# Altium schematic symbol library BARKO_SCHLIB.SchLib: 1064 symbols (part 7 of 11)
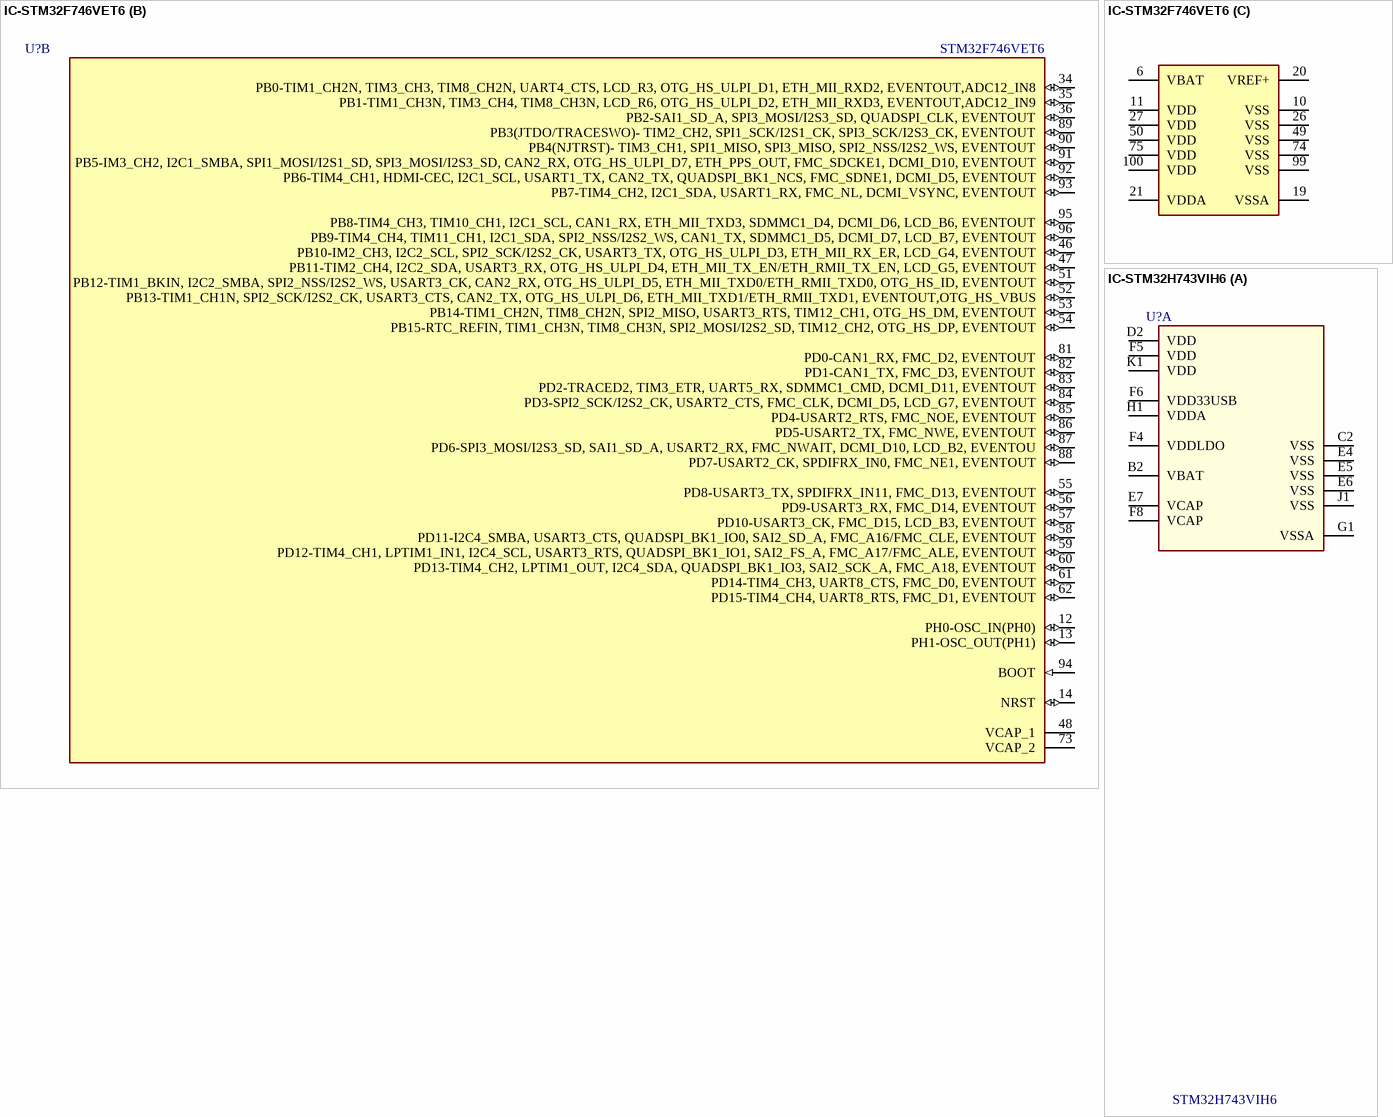
[diagram p47: symbols IC-STM32F746VET6 to IC-STM32H743VIH6]

## IC-STM32F746VET6
designator U?, comment STM32F746VET6
IC MCU 32BIT 512KB FLASH 100LQFP; Manufacturer: STMicroelectronics; Program Memory Size: 512 KByte; Packing: Tray; Supply Voltage Max: 3.6 V; Supply Voltage Min: 1.7 V; Data RAM Size: 320 KByte; L1 Cache Instruction Memory: 4 KByte; Clock Frequency Max: 216 MHz; Number of I/Os: 82; Frequency: 216MHz; RAM Size: 340KB; Min Supply Voltage: 1.7V; Max Supply Voltage: 3.6V; Washability: OK; .Creator: M.OZKAN; .PCBCHK: USED; PackageDescription: 100-Pin Low Profile Quad Flat Package, 14 x 14 mm Body, 0.5 mm Pitch; ComponentLink3URL: http://www.st.com/st-web-ui/static/active/en/resource/technical/document/data_brief/DM00071938.pdf; ComponentLink2URL: http://www.st.com/st-web-ui/static/active/en/resource/technical/document/datasheet/DM00166116.pdf; Mounting Technology: Surface Mount; Temperature Max: 85 degC; ComponentLink1Description: Manufacturer URL; ComponentLink3Description: Package Specification; Temperature Min: -40 degC; PartNumber: STM32F746VE; ComponentLink2Description: Datasheet; ComponentLink1URL: http://www.st.com/web/en/home.html; L1 Cache Data Memory: 4 KByte; DatasheetVersion: Rev. 1; Supplier 1: Digi-Key; Manufacturer Part Number: STM32F746VET6; Stock 1: 527; Pricing 1: 1=11.87000, 10=10.72200, 100=8.87720, 500=7.73016, 1000=6.73272 (USD); RoHS: No; Case/Package: LQFP; Number of Pins: 100; Memory Size: 512KB; REACH SVHC: No SVHC; ComponentLink4URL: http://www.mouser.com/ds/2/389/stm32f745ie-956321.pdf?src-supplier=Mouser; ComponentLink4Description: http://www.mouser.com/ds/2/389/stm32f745ie-956321.pdf?src-supplier=Mouser; ComponentLink5URL: http://www.farnell.com/datasheets/1994626.pdf?src-supplier=Farnell; ComponentLink5Description: http://www.farnell.com/datasheets/1994626.pdf?src-supplier=Farnell; ComponentLink6URL: http://www.farnell.com/datasheets/1994626.pdf?src-supplier=Element14; ComponentLink6Description: http://www.farnell.com/datasheets/1994626.pdf?src-supplier=Element14; ComponentLink7URL: http://www.st.com/content/ccc/resource/technical/document/errata_sheet/4d/39/a6/8c/84/47/47/67/DM00145382.pdf/files/DM00145382.pdf/jcr:content/translations/en.DM00145382.pdf?src-supplier=Digi-Key; ComponentLink7Description: http://www.st.com/content/ccc/resource/technical/document/errata_sheet/4d/39/a6/8c/84/47/47/67/DM00145382.pdf/files/DM00145382.pdf/jcr:content/translations/en.DM00145382.pdf?src-supplier=Digi-Key; Supplier Part Number 1: 497-16607-ND; .SCHCHK: USED
footprint STM-LQFP100_V (Thin QFP, 100-Leads, Body 14x14mm, Pitch 0.5mm, ST Recommended)
part A pins: 1 PE2-TRACECLK, SPI4_SCK, SAI1_MCLK_A, QUADSPI_BK1_IO2, ETH_MII_TXD3, FMC_A23, EVENTOUT (io), 2 PE3-TRACED0, SAI1_SD_B, FMC_A19, EVENTOUT (io), 3 PE4-TRACED1, SPI4_NSS, SAI1_FS_A, FMC_A20, DCMI_D4, LCD_B0, EVENTOUT (io), 4 PE5-TRACED2, TIM9_CH1, SPI4_MISO, SAI1_SCK_A, FMC_A21, DCMI_D6, LCD_G0, EVENTOUT (io), 5 PE6-TRACED3, TIM1_BKIN2, TIM9_CH2, SPI4_MOSI, SAI1_SD_A, SAI2_MCK_B, FMC_A22, DCMI_D7, LCD_G1, EVENTOUT (io), 7 PC13-RTC_TAMP1/RTC_TS/RTC_OUT,WKUP4,EVENTOUT (io), 8 PC14-OSC32_IN(PC14),EVENTOUT (io), 9 PC15-OSC32_OUT(PC15),EVENTOUT (io), 15 PC0-SAI2_FS_B, OTG_HS_ULPI_STP, FMC_SDNWE, LCD_R5, EVENTOUT,ADC123_IN10 (io), 16 PC1-TRACED0, SPI2_MOSI/I2S2_SD, SAI1_SD_A, ETH_MDC, EVENTOUT,ADC123_IN11, RTC_TAMP3, WKUP3 (io), 17 PC2-SPI2_MISO, OTG_HS_ULPI_DIR, ETH_MII_TXD2, FMC_SDNE0, EVENTOUT,ADC123_IN12 (io), 18 PC3-SPI2_MOSI/I2S2_SD, OTG_HS_ULPI_NXT, ETH_MII_TX_CLK, FMC_SDCKE0, EVENTOUT,ADC123_IN13 (io), 22 PA0-WKUP(PA0)-TIM2_CH1/TIM2_ETR, TIM5_CH1, TIM8_ETR, USART2_CTS, UART4_TX, SAI2_SD_B, ETH_MII_CRS, EVENTOUT (io), 23 PA1-TIM2_CH2, TIM5_CH2, USART2_RTS, UART4_RX, QUADSPI_BK1_IO3, SAI2_MCK_B, ETH_MII_RX_CLK/ETH_RMII_REF_CLK, LCD_R2, EVENTOUT,ADC123_IN1 (io), 24 PA2-TIM2_CH3, TIM5_CH3, TIM9_CH1, USART2_TX, SAI2_SCK_B, ETH_MDIO, LCD_R1, EVENTOUT,ADC123_IN2, WKUP2 (io), 25 PA3-TIM2_CH4, TIM5_CH4, TIM9_CH2, USART2_RX, OTG_HS_ULPI_D0, ETH_MII_COL, LCD_B5, EVENTOUT,ADC123_IN3 (io), 28 PA4-SPI1_NSS/I2S1_WS, SPI3_NSS/I2S3_WS, USART2_CK, OTG_HS_SOF, DCMI_HSYNC, LCD_VSYNC, EVENTOUT,ADC12_IN4, DAC_OUT1 (io), 29 PA5-TIM2_CH1/TIM2_ETR, TIM8_CH1N, SPI1_SCK/I2S1_CK, OTG_HS_ULPI_CK, LCD_R4, EVENTOUT,ADC12_IN5, DAC_OUT2 (io), 30 PA6-TIM1_BKIN, TIM3_CH1, TIM8_BKIN, SPI1_MISO, TIM13_CH1, DCMI_PIXCLK, LCD_G2, EVENTOUT,ADC12_IN6 (io), 31 PA7-TIM1_CH1N, TIM3_CH2, TIM8_CH1N, SPI1_MOSI/I2S1_SD, TIM14_CH1, ETH_MII_RX_DV/ETH_RMII_CRS_DV, FMC_SDNWE, EVENTOUT,ADC12_IN7 (io), 32 PC4-I2S1_MCK, SPDIFRX_IN2, ETH_MII_RXD0/ETH_RMII_RXD0, FMC_SDNE0, EVENTOUT,ADC12_IN14 (io), 33 PC5-SPDIFRX_IN3, ETH_MII_RXD1/ETH_RMII_RXD1, FMC_SDCKE0, EVENTOUT,ADC12_IN15 (io), 37 PE7-TIM1_ETR, UART7_Rx, QUADSPI_BK2_IO0, FMC_D4, EVENTOUT (io), 38 PE8-TIM1_CH1N, UART7_Tx, QUADSPI_BK2_IO1, FMC_D5, EVENTOUT (io), 39 PE9-TIM1_CH1, UART7_RTS, QUADSPI_BK2_IO2, FMC_D6, EVENTOUT (io), 40 PE10-TIM1_CH2N, UART7_CTS, QUADSPI_BK2_IO3, FMC_D7, EVENTOUT (io), 41 PE11-TIM1_CH2, SPI4_NSS, SAI2_SD_B, FMC_D8, LCD_G3, EVENTOUT (io), 42 PE12-TIM1_CH3N, SPI4_SCK, SAI2_SCK_B, FMC_D9, LCD_B4, EVENTOUT (io), 43 PE13-TIM1_CH3, SPI4_MISO, SAI2_FS_B, FMC_D10, LCD_DE, EVENTOUT (io), 44 PE14-TIM1_CH4, SPI4_MOSI, SAI2_MCK_B, FMC_D11, LCD_CLK, EVENTOUT (io), 45 PE15-TIM1_BKIN, FMC_D12, LCD_R7, EVENTOUT (io), 63 PC6-TIM3_CH1, TIM8_CH1, I2S2_MCK, USART6_TX, SDMMC1_D6, DCMI_D0, LCD_HSYNC, EVENTOUT (io), 64 PC7-TIM3_CH2, TIM8_CH2, I2S3_MCK, USART6_RX, SDMMC1_D7, DCMI_D1, LCD_G6, EVENTOUT (io), 65 PC8-TRACED1, TIM3_CH3, TIM8_CH3, UART5_RTS, USART6_CK, SDMMC1_D0, DCMI_D2, EVENTOUT (io), 66 PC9-MCO2, TIM3_CH4, TIM8_CH4, I2C3_SDA, I2S_CKIN, UART5_CTS, QUADSPI_BK1_IO0, SDMMC1_D1, DCMI_D3, EVENTOUT (io), 67 PA8-MCO1, TIM1_CH1, TIM8_BKIN2, I2C3_SCL, USART1_CK, OTG_FS_SOF, LCD_R6, EVENTOUT (io), 68 PA9-TIM1_CH2, I2C3_SMBA, SPI2_SCK/I2S2_CK, USART1_TX, DCMI_D0, EVENTOUTOTG_FS_VBUS (io), 69 PA10-TIM1_CH3, USART1_RX, OTG_FS_ID, DCMI_D1, EVENTOUT (io), 70 PA11-TIM1_CH4, USART1_CTS, CAN1_RX, OTG_FS_DM, LCD_R4, EVENTOUT (io), 71 PA12-IM1_ETR, USART1_RTS, SAI2_FS_B, CAN1_TX, OTG_FS_DP, LCD_R5, EVENTOUT (io), 72 PA13(JTMS-SWDIO),EVENTOUT (io), 76 PA14(JTCK-SWCLK) (io), 77 PA15(JTDI) TIM2_CH1/TIM2_ETR, HDMI-CEC, SPI1_NSS/I2S1_WS, SPI3_NSS/I2S3_WS, UART4_RTS, EVENTOUT (io), 78 PC10-SPI3_SCK/I2S3_CK, USART3_TX, UART4_TX, QUADSPI_BK1_IO1, SDMMC1_D2, DCMI_D8, LCD_R2, EVENTOUT (io), 79 PC11-SPI3_MISO, USART3_RX, UART4_RX, QUADSPI_BK2_NCS, SDMMC1_D3, DCMI_D4, EVENTOUT (io), 80 PC12-TRACED3, SPI3_MOSI/I2S3_SD, USART3_CK, UART5_TX, SDMMC1_CK, DCMI_D9, EVENTOUT (io), 97 PE0-TIM4_ETR, LPTIM1_ETR, UART8_Rx, SAI2_MCK_A, FMC_NBL0, DCMI_D2, EVENTOUT (io), 98 PE1-LPTIM1_IN2, UART8_Tx, FMC_NBL1, DCMI_D3, EVENTOUT (io)
part B pins: 12 PH0-OSC_IN(PH0) (io), 13 PH1-OSC_OUT(PH1) (io), 14 NRST (io), 34 PB0-TIM1_CH2N, TIM3_CH3, TIM8_CH2N, UART4_CTS, LCD_R3, OTG_HS_ULPI_D1, ETH_MII_RXD2, EVENTOUT,ADC12_IN8 (io), 35 PB1-TIM1_CH3N, TIM3_CH4, TIM8_CH3N, LCD_R6, OTG_HS_ULPI_D2, ETH_MII_RXD3, EVENTOUT,ADC12_IN9 (io), 36 PB2-SAI1_SD_A, SPI3_MOSI/I2S3_SD, QUADSPI_CLK, EVENTOUT (io), 46 PB10-IM2_CH3, I2C2_SCL, SPI2_SCK/I2S2_CK, USART3_TX, OTG_HS_ULPI_D3, ETH_MII_RX_ER, LCD_G4, EVENTOUT (io), 47 PB11-TIM2_CH4, I2C2_SDA, USART3_RX, OTG_HS_ULPI_D4, ETH_MII_TX_EN/ETH_RMII_TX_EN, LCD_G5, EVENTOUT (io), 48 VCAP_1 (power), 51 PB12-TIM1_BKIN, I2C2_SMBA, SPI2_NSS/I2S2_WS, USART3_CK, CAN2_RX, OTG_HS_ULPI_D5, ETH_MII_TXD0/ETH_RMII_TXD0, OTG_HS_ID, EVENTOUT (io), 52 PB13-TIM1_CH1N, SPI2_SCK/I2S2_CK, USART3_CTS, CAN2_TX, OTG_HS_ULPI_D6, ETH_MII_TXD1/ETH_RMII_TXD1, EVENTOUT,OTG_HS_VBUS (io), 53 PB14-TIM1_CH2N, TIM8_CH2N, SPI2_MISO, USART3_RTS, TIM12_CH1, OTG_HS_DM, EVENTOUT (io), 54 PB15-RTC_REFIN, TIM1_CH3N, TIM8_CH3N, SPI2_MOSI/I2S2_SD, TIM12_CH2, OTG_HS_DP, EVENTOUT (io), 55 PD8-USART3_TX, SPDIFRX_IN11, FMC_D13, EVENTOUT (io), 56 PD9-USART3_RX, FMC_D14, EVENTOUT (io), 57 PD10-USART3_CK, FMC_D15, LCD_B3, EVENTOUT (io), 58 PD11-I2C4_SMBA, USART3_CTS, QUADSPI_BK1_IO0, SAI2_SD_A, FMC_A16/FMC_CLE, EVENTOUT (io), 59 PD12-TIM4_CH1, LPTIM1_IN1, I2C4_SCL, USART3_RTS, QUADSPI_BK1_IO1, SAI2_FS_A, FMC_A17/FMC_ALE, EVENTOUT (io), 60 PD13-TIM4_CH2, LPTIM1_OUT, I2C4_SDA, QUADSPI_BK1_IO3, SAI2_SCK_A, FMC_A18, EVENTOUT (io), 61 PD14-TIM4_CH3, UART8_CTS, FMC_D0, EVENTOUT (io), 62 PD15-TIM4_CH4, UART8_RTS, FMC_D1, EVENTOUT (io), 73 VCAP_2 (power), 81 PD0-CAN1_RX, FMC_D2, EVENTOUT (io), 82 PD1-CAN1_TX, FMC_D3, EVENTOUT (io), 83 PD2-TRACED2, TIM3_ETR, UART5_RX, SDMMC1_CMD, DCMI_D11, EVENTOUT (io), 84 PD3-SPI2_SCK/I2S2_CK, USART2_CTS, FMC_CLK, DCMI_D5, LCD_G7, EVENTOUT (io), 85 PD4-USART2_RTS, FMC_NOE, EVENTOUT (io), 86 PD5-USART2_TX, FMC_NWE, EVENTOUT (io), 87 PD6-SPI3_MOSI/I2S3_SD, SAI1_SD_A, USART2_RX, FMC_NWAIT, DCMI_D10, LCD_B2, EVENTOU (io), 88 PD7-USART2_CK, SPDIFRX_IN0, FMC_NE1, EVENTOUT (io), 89 PB3(JTDO/TRACESWO)- TIM2_CH2, SPI1_SCK/I2S1_CK, SPI3_SCK/I2S3_CK, EVENTOUT (io), 90 PB4(NJTRST)- TIM3_CH1, SPI1_MISO, SPI3_MISO, SPI2_NSS/I2S2_WS, EVENTOUT (io), 91 PB5-IM3_CH2, I2C1_SMBA, SPI1_MOSI/I2S1_SD, SPI3_MOSI/I2S3_SD, CAN2_RX, OTG_HS_ULPI_D7, ETH_PPS_OUT, FMC_SDCKE1, DCMI_D10, EVENTOUT (io), 92 PB6-TIM4_CH1, HDMI-CEC, I2C1_SCL, USART1_TX, CAN2_TX, QUADSPI_BK1_NCS, FMC_SDNE1, DCMI_D5, EVENTOUT (io), 93 PB7-TIM4_CH2, I2C1_SDA, USART1_RX, FMC_NL, DCMI_VSYNC, EVENTOUT (io), 94 BOOT (in), 95 PB8-TIM4_CH3, TIM10_CH1, I2C1_SCL, CAN1_RX, ETH_MII_TXD3, SDMMC1_D4, DCMI_D6, LCD_B6, EVENTOUT (io), 96 PB9-TIM4_CH4, TIM11_CH1, I2C1_SDA, SPI2_NSS/I2S2_WS, CAN1_TX, SDMMC1_D5, DCMI_D7, LCD_B7, EVENTOUT (io)
part C pins: 6 VBAT (power), 10 VSS (power), 11 VDD (power), 19 VSSA (power), 20 VREF+ (power), 21 VDDA (power), 26 VSS (power), 27 VDD (power), 49 VSS (power), 50 VDD (power), 74 VSS (power), 75 VDD (power), 99 VSS (power), 100 VDD (power)

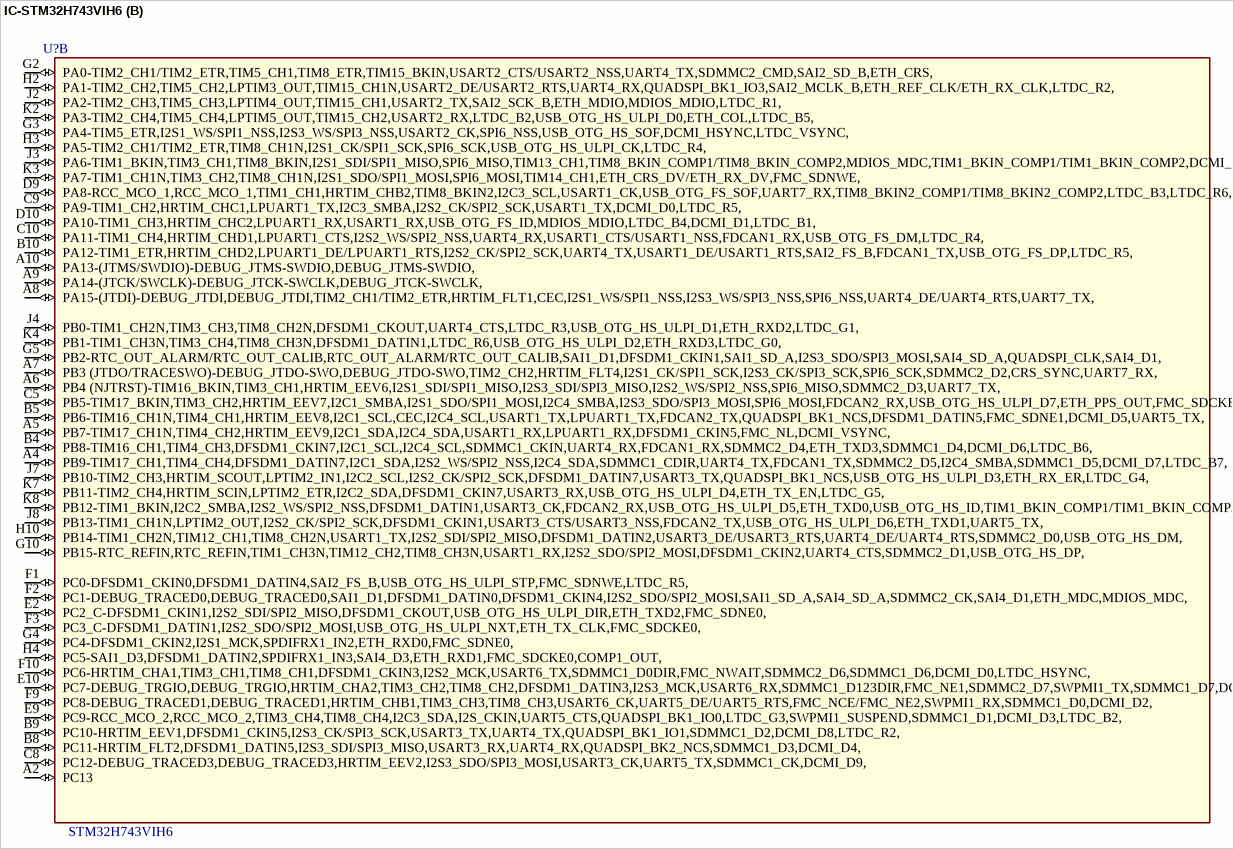
[diagram p28: symbol IC-STM32H743VIH6]

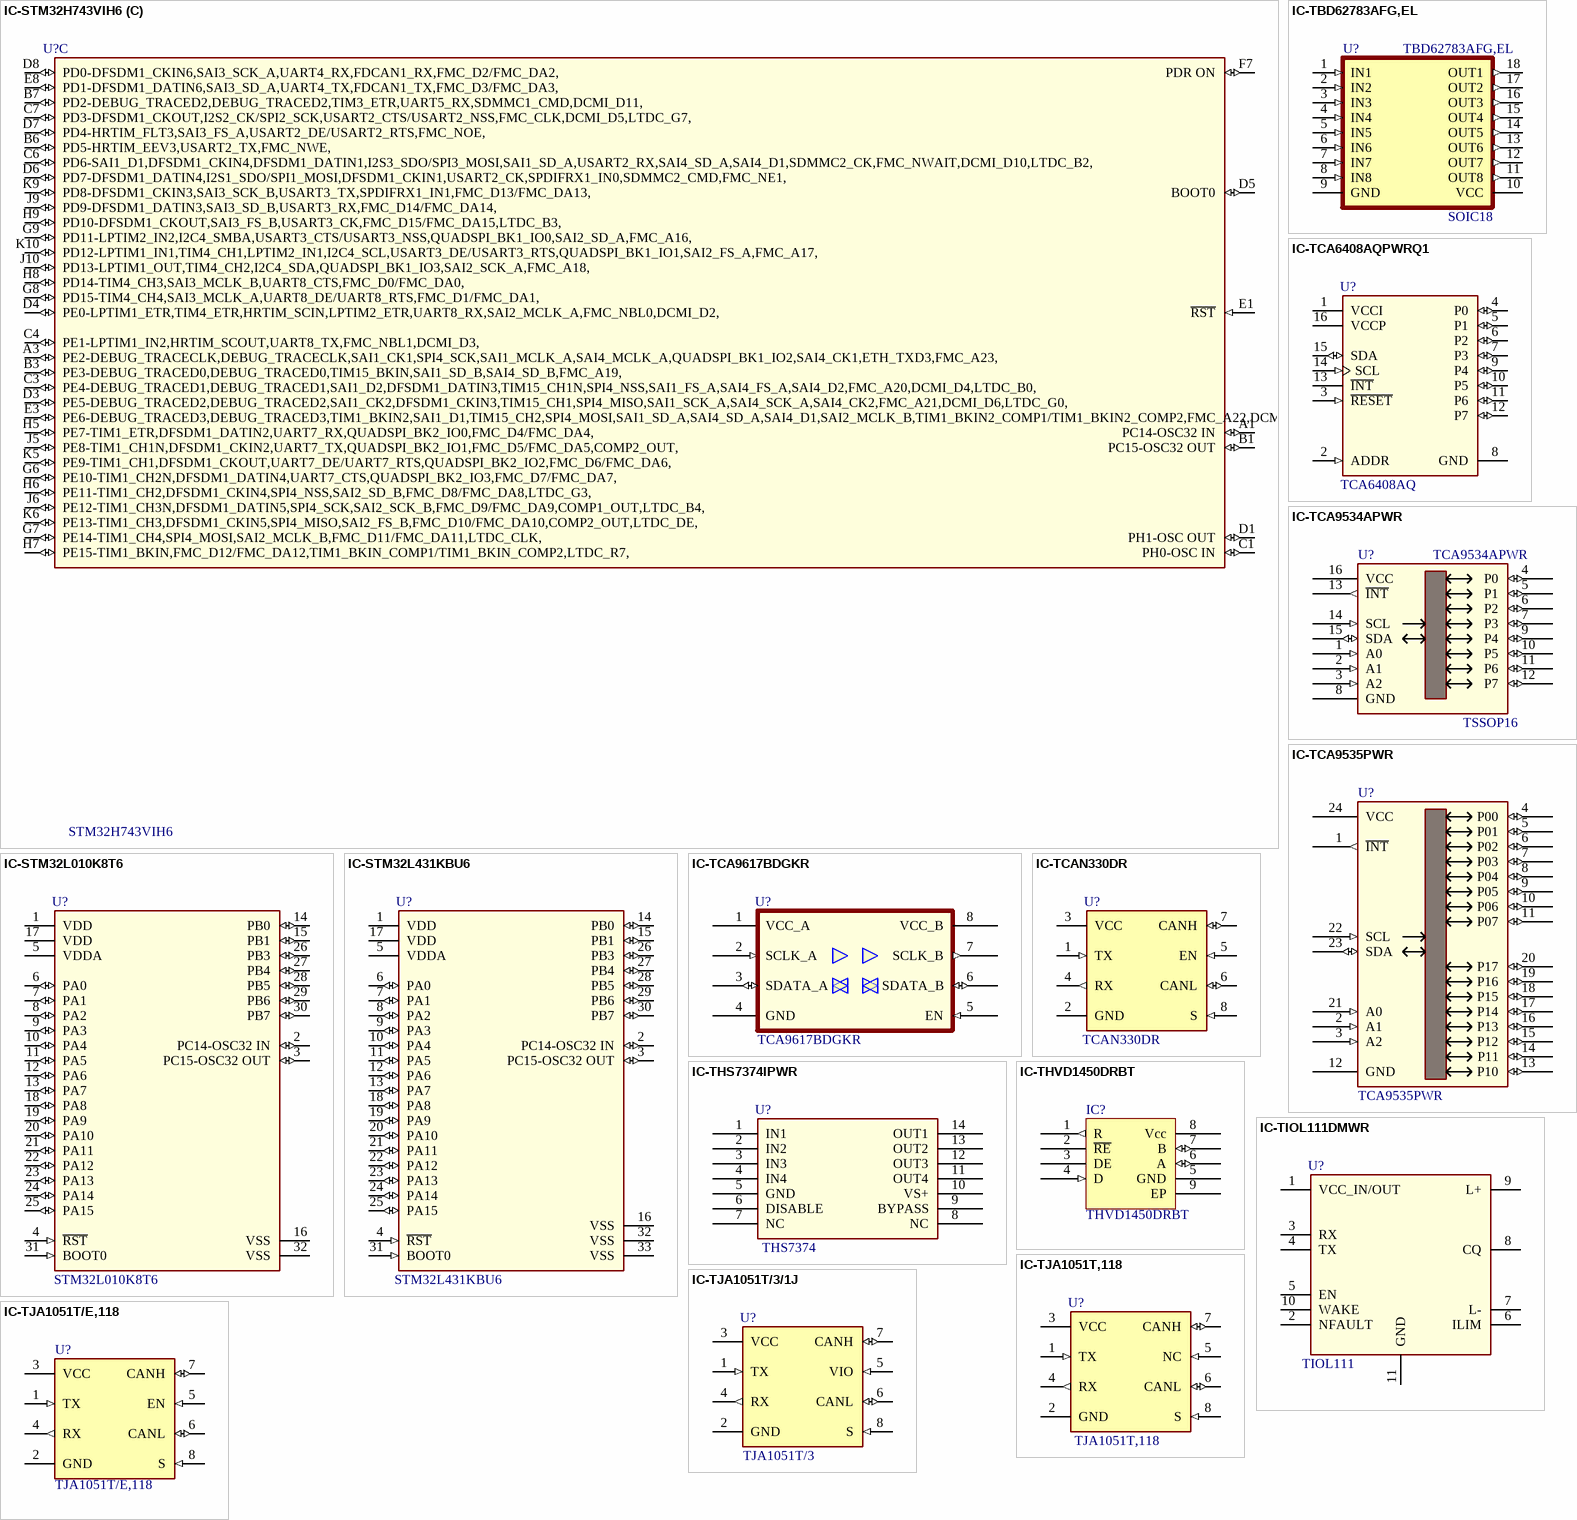
[diagram p29: symbols IC-STM32H743VIH6 to IC-TJA1051T/E,118]

## IC-STM32H743VIH6
designator U?, comment STM32H743VIH6
HIGH-PERFORMANCE AND DSP WITH DP; Manufacturer: STMicroelectronics; Supplier 1: Digi-Key; Supplier Part Number 1: 497-STM32H743VIH6-ND; Manufacturer Part Number: STM32H743VIH6; Stock: 618; Pricing: 1=13.52, 10=12.429, 25=11.914, 100=10.4971, 250=9.9819, 500=9.3379, 1000=8.5651, 2500=8.2431, 5000=8.1963 (USD); RoHS: No; ComponentLink1Description: Datasheet; ComponentLink1URL: https://www.st.com/resource/en/datasheet/stm32h743ai.pdf
footprint TFBGA100-A08Q-IPC_B
part A pins: B2 VBAT (power), C2 VSS (power), D2 VDD (power), E4 VSS (power), E5 VSS (power), E6 VSS (power), E7 VCAP (power), F4 VDDLDO (power), F5 VDD (power), F6 VDD33USB (power), F8 VCAP (power), G1 VSSA (power), H1 VDDA (power), J1 VSS (power), K1 VDD (power)
part B pins: A2 PC13 (io), A4 PB9-TIM17_CH1,TIM4_CH4,DFSDM1_DATIN7,I2C1_SDA,I2S2_WS/SPI2_NSS,I2C4_SDA,SDMMC1_CDIR,UART4_TX,FDCAN1_TX,SDMMC2_D5,I2C4_SMBA,SDMMC1_D5,DCMI_D7,LTDC_B7, (io), A5 PB7-TIM17_CH1N,TIM4_CH2,HRTIM_EEV9,I2C1_SDA,I2C4_SDA,USART1_RX,LPUART1_RX,DFSDM1_CKIN5,FMC_NL,DCMI_VSYNC, (io), A6 PB4 (NJTRST)-TIM16_BKIN,TIM3_CH1,HRTIM_EEV6,I2S1_SDI/SPI1_MISO,I2S3_SDI/SPI3_MISO,I2S2_WS/SPI2_NSS,SPI6_MISO,SDMMC2_D3,UART7_TX, (io), A7 PB3 (JTDO/TRACESWO)-DEBUG_JTDO-SWO,DEBUG_JTDO-SWO,TIM2_CH2,HRTIM_FLT4,I2S1_CK/SPI1_SCK,I2S3_CK/SPI3_SCK,SPI6_SCK,SDMMC2_D2,CRS_SYNC,UART7_RX, (io), A8 PA15-(JTDI)-DEBUG_JTDI,DEBUG_JTDI,TIM2_CH1/TIM2_ETR,HRTIM_FLT1,CEC,I2S1_WS/SPI1_NSS,I2S3_WS/SPI3_NSS,SPI6_NSS,UART4_DE/UART4_RTS,UART7_TX, (io), A9 PA14-(JTCK/SWCLK)-DEBUG_JTCK-SWCLK,DEBUG_JTCK-SWCLK, (io), A10 PA13-(JTMS/SWDIO)-DEBUG_JTMS-SWDIO,DEBUG_JTMS-SWDIO, (io), B4 PB8-TIM16_CH1,TIM4_CH3,DFSDM1_CKIN7,I2C1_SCL,I2C4_SCL,SDMMC1_CKIN,UART4_RX,FDCAN1_RX,SDMMC2_D4,ETH_TXD3,SDMMC1_D4,DCMI_D6,LTDC_B6, (io), B5 PB6-TIM16_CH1N,TIM4_CH1,HRTIM_EEV8,I2C1_SCL,CEC,I2C4_SCL,USART1_TX,LPUART1_TX,FDCAN2_TX,QUADSPI_BK1_NCS,DFSDM1_DATIN5,FMC_SDNE1,DCMI_D5,UART5_TX, (io), B8 PC11-HRTIM_FLT2,DFSDM1_DATIN5,I2S3_SDI/SPI3_MISO,USART3_RX,UART4_RX,QUADSPI_BK2_NCS,SDMMC1_D3,DCMI_D4, (io), B9 PC10-HRTIM_EEV1,DFSDM1_CKIN5,I2S3_CK/SPI3_SCK,USART3_TX,UART4_TX,QUADSPI_BK1_IO1,SDMMC1_D2,DCMI_D8,LTDC_R2, (io), B10 PA12-TIM1_ETR,HRTIM_CHD2,LPUART1_DE/LPUART1_RTS,I2S2_CK/SPI2_SCK,UART4_TX,USART1_DE/USART1_RTS,SAI2_FS_B,FDCAN1_TX,USB_OTG_FS_DP,LTDC_R5, (io), C5 PB5-TIM17_BKIN,TIM3_CH2,HRTIM_EEV7,I2C1_SMBA,I2S1_SDO/SPI1_MOSI,I2C4_SMBA,I2S3_SDO/SPI3_MOSI,SPI6_MOSI,FDCAN2_RX,USB_OTG_HS_ULPI_D7,ETH_PPS_OUT,FMC_SDCKE1,DCMI_D10,UART5_RX, (io), C8 PC12-DEBUG_TRACED3,DEBUG_TRACED3,HRTIM_EEV2,I2S3_SDO/SPI3_MOSI,USART3_CK,UART5_TX,SDMMC1_CK,DCMI_D9, (io), C9 PA9-TIM1_CH2,HRTIM_CHC1,LPUART1_TX,I2C3_SMBA,I2S2_CK/SPI2_SCK,USART1_TX,DCMI_D0,LTDC_R5, (io), C10 PA11-TIM1_CH4,HRTIM_CHD1,LPUART1_CTS,I2S2_WS/SPI2_NSS,UART4_RX,USART1_CTS/USART1_NSS,FDCAN1_RX,USB_OTG_FS_DM,LTDC_R4, (io), D9 PA8-RCC_MCO_1,RCC_MCO_1,TIM1_CH1,HRTIM_CHB2,TIM8_BKIN2,I2C3_SCL,USART1_CK,USB_OTG_FS_SOF,UART7_RX,TIM8_BKIN2_COMP1/TIM8_BKIN2_COMP2,LTDC_B3,LTDC_R6, (io), D10 PA10-TIM1_CH3,HRTIM_CHC2,LPUART1_RX,USART1_RX,USB_OTG_FS_ID,MDIOS_MDIO,LTDC_B4,DCMI_D1,LTDC_B1, (io), E2 PC2_C-DFSDM1_CKIN1,I2S2_SDI/SPI2_MISO,DFSDM1_CKOUT,USB_OTG_HS_ULPI_DIR,ETH_TXD2,FMC_SDNE0, (io), E9 PC9-RCC_MCO_2,RCC_MCO_2,TIM3_CH4,TIM8_CH4,I2C3_SDA,I2S_CKIN,UART5_CTS,QUADSPI_BK1_IO0,LTDC_G3,SWPMI1_SUSPEND,SDMMC1_D1,DCMI_D3,LTDC_B2, (io), E10 PC7-DEBUG_TRGIO,DEBUG_TRGIO,HRTIM_CHA2,TIM3_CH2,TIM8_CH2,DFSDM1_DATIN3,I2S3_MCK,USART6_RX,SDMMC1_D123DIR,FMC_NE1,SDMMC2_D7,SWPMI1_TX,SDMMC1_D7,DCMI_D1,LTDC_G6, (io), F1 PC0-DFSDM1_CKIN0,DFSDM1_DATIN4,SAI2_FS_B,USB_OTG_HS_ULPI_STP,FMC_SDNWE,LTDC_R5, (io), F2 PC1-DEBUG_TRACED0,DEBUG_TRACED0,SAI1_D1,DFSDM1_DATIN0,DFSDM1_CKIN4,I2S2_SDO/SPI2_MOSI,SAI1_SD_A,SAI4_SD_A,SDMMC2_CK,SAI4_D1,ETH_MDC,MDIOS_MDC, (io), F3 PC3_C-DFSDM1_DATIN1,I2S2_SDO/SPI2_MOSI,USB_OTG_HS_ULPI_NXT,ETH_TX_CLK,FMC_SDCKE0, (io), F9 PC8-DEBUG_TRACED1,DEBUG_TRACED1,HRTIM_CHB1,TIM3_CH3,TIM8_CH3,USART6_CK,UART5_DE/UART5_RTS,FMC_NCE/FMC_NE2,SWPMI1_RX,SDMMC1_D0,DCMI_D2, (io), F10 PC6-HRTIM_CHA1,TIM3_CH1,TIM8_CH1,DFSDM1_CKIN3,I2S2_MCK,USART6_TX,SDMMC1_D0DIR,FMC_NWAIT,SDMMC2_D6,SDMMC1_D6,DCMI_D0,LTDC_HSYNC, (io), G2 PA0-TIM2_CH1/TIM2_ETR,TIM5_CH1,TIM8_ETR,TIM15_BKIN,USART2_CTS/USART2_NSS,UART4_TX,SDMMC2_CMD,SAI2_SD_B,ETH_CRS, (io), G3 PA4-TIM5_ETR,I2S1_WS/SPI1_NSS,I2S3_WS/SPI3_NSS,USART2_CK,SPI6_NSS,USB_OTG_HS_SOF,DCMI_HSYNC,LTDC_VSYNC, (io), G4 PC4-DFSDM1_CKIN2,I2S1_MCK,SPDIFRX1_IN2,ETH_RXD0,FMC_SDNE0, (io), G5 PB2-RTC_OUT_ALARM/RTC_OUT_CALIB,RTC_OUT_ALARM/RTC_OUT_CALIB,SAI1_D1,DFSDM1_CKIN1,SAI1_SD_A,I2S3_SDO/SPI3_MOSI,SAI4_SD_A,QUADSPI_CLK,SAI4_D1, (io), G10 PB15-RTC_REFIN,RTC_REFIN,TIM1_CH3N,TIM12_CH2,TIM8_CH3N,USART1_RX,I2S2_SDO/SPI2_MOSI,DFSDM1_CKIN2,UART4_CTS,SDMMC2_D1,USB_OTG_HS_DP, (io), H2 PA1-TIM2_CH2,TIM5_CH2,LPTIM3_OUT,TIM15_CH1N,USART2_DE/USART2_RTS,UART4_RX,QUADSPI_BK1_IO3,SAI2_MCLK_B,ETH_REF_CLK/ETH_RX_CLK,LTDC_R2, (io), H3 PA5-TIM2_CH1/TIM2_ETR,TIM8_CH1N,I2S1_CK/SPI1_SCK,SPI6_SCK,USB_OTG_HS_ULPI_CK,LTDC_R4, (io), H4 PC5-SAI1_D3,DFSDM1_DATIN2,SPDIFRX1_IN3,SAI4_D3,ETH_RXD1,FMC_SDCKE0,COMP1_OUT, (io), H10 PB14-TIM1_CH2N,TIM12_CH1,TIM8_CH2N,USART1_TX,I2S2_SDI/SPI2_MISO,DFSDM1_DATIN2,USART3_DE/USART3_RTS,UART4_DE/UART4_RTS,SDMMC2_D0,USB_OTG_HS_DM, (io), J2 PA2-TIM2_CH3,TIM5_CH3,LPTIM4_OUT,TIM15_CH1,USART2_TX,SAI2_SCK_B,ETH_MDIO,MDIOS_MDIO,LTDC_R1, (io), J3 PA6-TIM1_BKIN,TIM3_CH1,TIM8_BKIN,I2S1_SDI/SPI1_MISO,SPI6_MISO,TIM13_CH1,TIM8_BKIN_COMP1/TIM8_BKIN_COMP2,MDIOS_MDC,TIM1_BKIN_COMP1/TIM1_BKIN_COMP2,DCMI_PIXCLK,LTDC_G2, (io), J4 PB0-TIM1_CH2N,TIM3_CH3,TIM8_CH2N,DFSDM1_CKOUT,UART4_CTS,LTDC_R3,USB_OTG_HS_ULPI_D1,ETH_RXD2,LTDC_G1, (io), J7 PB10-TIM2_CH3,HRTIM_SCOUT,LPTIM2_IN1,I2C2_SCL,I2S2_CK/SPI2_SCK,DFSDM1_DATIN7,USART3_TX,QUADSPI_BK1_NCS,USB_OTG_HS_ULPI_D3,ETH_RX_ER,LTDC_G4, (io), J8 PB13-TIM1_CH1N,LPTIM2_OUT,I2S2_CK/SPI2_SCK,DFSDM1_CKIN1,USART3_CTS/USART3_NSS,FDCAN2_TX,USB_OTG_HS_ULPI_D6,ETH_TXD1,UART5_TX, (io), K2 PA3-TIM2_CH4,TIM5_CH4,LPTIM5_OUT,TIM15_CH2,USART2_RX,LTDC_B2,USB_OTG_HS_ULPI_D0,ETH_COL,LTDC_B5, (io), K3 PA7-TIM1_CH1N,TIM3_CH2,TIM8_CH1N,I2S1_SDO/SPI1_MOSI,SPI6_MOSI,TIM14_CH1,ETH_CRS_DV/ETH_RX_DV,FMC_SDNWE, (io), K4 PB1-TIM1_CH3N,TIM3_CH4,TIM8_CH3N,DFSDM1_DATIN1,LTDC_R6,USB_OTG_HS_ULPI_D2,ETH_RXD3,LTDC_G0, (io), K7 PB11-TIM2_CH4,HRTIM_SCIN,LPTIM2_ETR,I2C2_SDA,DFSDM1_CKIN7,USART3_RX,USB_OTG_HS_ULPI_D4,ETH_TX_EN,LTDC_G5, (io), K8 PB12-TIM1_BKIN,I2C2_SMBA,I2S2_WS/SPI2_NSS,DFSDM1_DATIN1,USART3_CK,FDCAN2_RX,USB_OTG_HS_ULPI_D5,ETH_TXD0,USB_OTG_HS_ID,TIM1_BKIN_COMP1/TIM1_BKIN_COMP2,UART5_RX, (io)